# Altium footprint library lib_protel_HC_BOINA.PCBLIB: 726 footprints (part 29 of 46)
Each footprint in its own frame and in the unit in brackets; x right, y up, seen from the top. Pads: shape width x height; smd on the part's side, far side on the other; paste and mask are expansions set on the pad; w line width, h text height; cw(c..) or ccw(c..) is an arc to the next point about the centre after c.
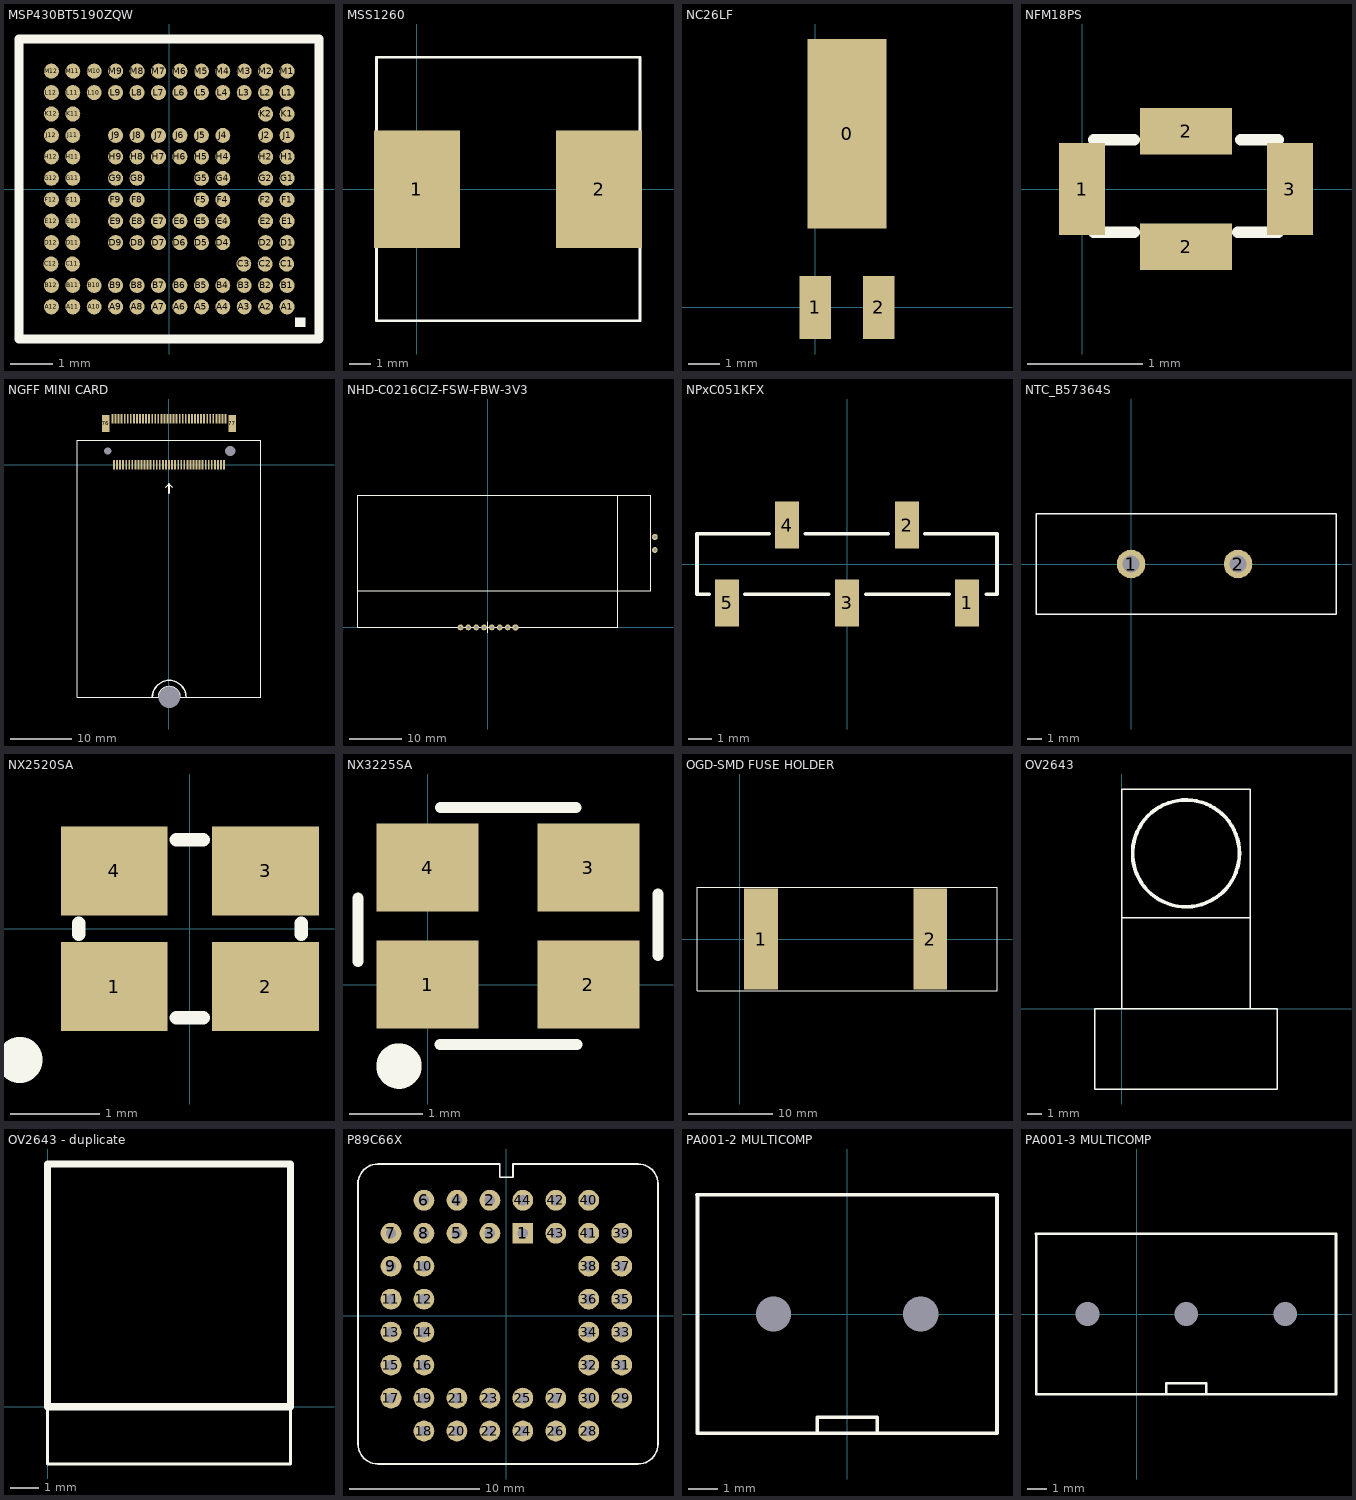
[diagram p28: the footprints below, top view; thin cyan lines are the x and y axes]

## MSP430BT5190ZQW [mm] "MSP430BT5190ZQW"
height 1
pads (113):
  round 0.35 smd mask+0.025: A1(2.755,-2.75) A2(2.255,-2.75) A3(1.755,-2.75) A4(1.255,-2.75) A5(0.755,-2.75) A6(0.255,-2.75) A7(-0.245,-2.75) A8(-0.745,-2.75) A9(-1.245,-2.75) A10(-1.745,-2.75) A11(-2.245,-2.75) A12(-2.745,-2.75) B1(2.755,-2.25) B2(2.255,-2.25) B3(1.755,-2.25) B4(1.255,-2.25) B5(0.755,-2.25) B6(0.255,-2.25) B7(-0.245,-2.25) B8(-0.745,-2.25) B9(-1.245,-2.25) B10(-1.745,-2.25) B11(-2.245,-2.25) B12(-2.745,-2.25) C1(2.745,-1.75) C2(2.245,-1.75) C3(1.745,-1.75) C11(-2.255,-1.75) C12(-2.755,-1.75) D1(2.755,-1.25) D2(2.255,-1.25) D4(1.255,-1.25) D5(0.755,-1.25) D6(0.255,-1.25) D7(-0.245,-1.25) D8(-0.745,-1.25) D9(-1.245,-1.25) D11(-2.245,-1.25) D12(-2.745,-1.25) E1(2.755,-0.75) E2(2.255,-0.75) E4(1.255,-0.75) E5(0.755,-0.75) E6(0.255,-0.75) E7(-0.245,-0.75) E8(-0.745,-0.75) E9(-1.245,-0.75) E11(-2.245,-0.75) E12(-2.745,-0.75) F1(2.755,-0.25) F2(2.255,-0.25) F4(1.255,-0.25) F5(0.755,-0.25) F8(-0.745,-0.25) F9(-1.245,-0.25) F11(-2.245,-0.25) F12(-2.745,-0.25) G1(2.755,0.25) G2(2.255,0.25) G4(1.255,0.25) G5(0.755,0.25) G8(-0.745,0.25) G9(-1.245,0.25) G11(-2.245,0.25) G12(-2.745,0.25) H1(2.755,0.75) H2(2.255,0.75) H4(1.255,0.75) H5(0.755,0.75) H6(0.255,0.75) H7(-0.245,0.75) H8(-0.745,0.75) H9(-1.245,0.75) H11(-2.245,0.75) H12(-2.745,0.75) J1(2.755,1.25) J2(2.255,1.25) J4(1.255,1.25) J5(0.755,1.25) J6(0.255,1.25) J7(-0.245,1.25) J8(-0.745,1.25) J9(-1.245,1.25) J11(-2.245,1.25) J12(-2.745,1.25) K1(2.755,1.75) K2(2.255,1.75) K11(-2.245,1.75) K12(-2.745,1.75) L1(2.755,2.25) L2(2.255,2.25) L3(1.755,2.25) L4(1.255,2.25) L5(0.755,2.25) L6(0.255,2.25) L7(-0.245,2.25) L8(-0.745,2.25) L9(-1.245,2.25) L10(-1.745,2.25) L11(-2.245,2.25) L12(-2.745,2.25) M1(2.755,2.75) M2(2.255,2.75) M3(1.755,2.75) M4(1.255,2.75) M5(0.755,2.75) M6(0.255,2.75) M7(-0.245,2.75) M8(-0.745,2.75) M9(-1.245,2.75) M10(-1.745,2.75) M11(-2.245,2.75) M12(-2.745,2.75)
Top Overlay:
  rectangle: 2.94,-3.22 3.19,-3
  lines w0.2: -3.5,-3.5 3.5,-3.5 3.5,3.5 -3.5,3.5 -3.5,-3.5

## MSS1260 [mm] "MSS1260"
height 6
pads (2):
  rect 4x5.5 smd: 1(0,0) 2(8.5,0)
Top Overlay:
  lines w0.127: -1.89,-6.14 10.41,-6.14 10.41,6.16 -1.89,6.16 -1.89,-6.14

## NC26LF [mm] "CLOCK CILINDRICO NC26LF"
height 2
pads (3):
  rect 2.5x6 smd: 0(1,5.5)
  rect 1x2 smd: 1(0,0) 2(2,0)

## NFM18PS [mm] "FILTRO"
height 0.6
pads (4):
  rect 0.4x0.8 smd: 1(0,0) 3(1.8,0)
  rect 0.8x0.4 smd: 2(0.9,-0.5) 2(0.9,0.5)
Top Overlay:
  lines w0.1: 0.1,-0.375 0.45,-0.375 ; 0.45,0.425 0.1,0.425 ; 1.375,0.425 1.7,0.425 ; 1.7,-0.375 1.35,-0.375 ; 0.1,0.425 0.1,0.425 ; 1.35,-0.375 1.35,-0.375 ; 1.7,0.425 1.7,0.425

## NGFF MINI CARD [mm] "MINI CARD FOR NGFF"
height 3.2
pads (80):
  round 0 hole 1.2: 0(-10,2.275)
  round 0 hole 3.5: 0(0.038,-37.975)
  round 0 hole 1.7: 0(10,2.275)
  rect 0.3x1.55 smd: 1(-9.25,7.55) 2(-9,0) 3(-8.75,7.55) 4(-8.5,0) 5(-8.25,7.55) 6(-8,0) 7(-7.75,7.55) 8(-7.5,0) 9(-7.25,7.55) 10(-7,0) 11(-6.75,7.55) 12(-6.5,0) 13(-6.25,7.55) 14(-6,0) 15(-5.75,7.55) 16(-5.5,0) 17(-5.25,7.55) 18(-5,0) 19(-4.75,7.55) 20(-4.5,0) 21(-4.25,7.55) 22(-4,0) 23(-3.75,7.55) 24(-3.5,0) 25(-3.25,7.55) 26(-3,0) 27(-2.75,7.55) 28(-2.5,0) 29(-2.25,7.55) 30(-2,0) 31(-1.75,7.55) 32(-1.5,0) 33(-1.25,7.55) 34(-1,0) 35(-0.75,7.55) 36(-0.5,0) 37(-0.25,7.55) 38(0,0) 39(0.25,7.55) 40(0.5,0) 41(0.75,7.55) 42(1,0) 43(1.25,7.55) 44(1.5,0) 45(1.75,7.55) 46(2,0) 47(2.25,7.55) 48(2.5,0) 49(2.75,7.55) 50(3,0) 51(3.25,7.55) 52(3.5,0) 53(3.75,7.55) 54(4,0) 55(4.25,7.55) 56(4.5,0) 57(4.75,7.55) 58(5,0) 59(5.25,7.55) 60(5.5,0) 61(5.75,7.55) 62(6,0) 63(6.25,7.55) 63(6.75,7.55) 64(6.5,0) 65(7.25,7.55) 66(7,0) 68(7.5,0) 69(7.75,7.55) 70(8,0) 71(8.25,7.55) 72(8.5,0) 73(8.75,7.55) 74(9,0) 75(9.25,7.55)
  rect 1.2x2.75 smd: 76(-10.35,6.793) 77(10.35,6.793)
Top Overlay:
  lines w0.1: -15,-37.975 15,-37.975 15,4.025 -15,4.025 -15,-37.975
  lines w0.254: -2.712,-37.975 cw(c0.038,-37.987) 2.787,-37.975 ; -1.712,-37.975 cw(c0.038,-37.983) 1.787,-37.975 ; -0.5,-3.625 -0.013,-3.137 -0.013,-3.125 ; -0.025,-3.125 0,-3.125 ; 0,-4.65 0,-3.125 ; 0.5,-3.625 0,-3.125

## NHD-C0216CIZ-FSW-FBW-3V3 [mm] "DISPLAY I2C"
height 5.5
pads (10):
  round 1.2 hole 0.6: 1(5.25,0)
  round 1.1 hole 0.6: 2(3.75,0) 3(2.25,0) 4(0.75,0) 5(-0.75,0) 6(-2.25,0) 7(-3.75,0) 8(-5.25,0) A(31.9,14.8)
  oval 1.1x1.2 hole 0.6: K(31.9,17.3)
Top Overlay:
  lines w0.2: -24.85,7 24.85,7 ; 0,-1.05 0,1.05 ; 24.84,7 24.84,25.3 ; 24.85,7 24.85,0 -24.85,0 -24.85,25.3 31.15,25.3 31.15,7 24.85,7

## NPxC051KFX [mm] "para NOPxCxx1KFXx-RC"
pads (5):
  rect 1x2 smd: 1(5.08,-1.65) 2(2.54,1.65) 3(0,-1.65) 4(-2.54,1.65) 5(-5.08,-1.65)
Top Overlay:
  lines w0.15: -5.825,-1.275 -6.35,-1.275 -6.35,1.275 -3.3,1.275 ; -4.325,-1.275 -0.775,-1.275 ; -1.775,1.275 1.75,1.275 ; 0.8,-1.275 4.325,-1.275 ; 3.3,1.275 6.35,1.275 6.35,-1.275 5.9,-1.275
3D body "10487, NPxC051KFXC-RC.STEP": height 7.1, standoff -0.4, extent -6.35,-2.17 6.35,2.1

## NTC_B57364S [mm] "NTC"
height 28
pads (2):
  round 2 hole 1.2: 1(0,0) 2(7.493,0)
Top Overlay:
  lines w0.1: -6.655,-3.505 -6.655,3.505 14.351,3.505 14.351,-3.505 -6.655,-3.505

## NX2520SA [mm] "CRISTAL NDK 26MHZ"
height 0.5
pads (4):
  rect 1.2x1 smd: 1(-0.85,-0.65) 2(0.85,-0.65) 3(0.85,0.65) 4(-0.85,0.65)
Top Overlay:
  lines w0.152: -1.25,-0.06 -1.25,0.06 ; -0.15,-1 0.15,-1 ; -0.15,1 0.15,1 ; 1.25,-0.06 1.25,0.06
  lines w0.5: -1.905,-1.473 cw(c-1.912,-1.473) -1.905,-1.472

## NX3225SA [mm] "CRISTAL NDK 32MHZ"
height 0.7
pads (4):
  rect 1.4x1.2 smd: 1(0,0) 2(2.2,0) 3(2.2,1.6) 4(0,1.6)
Top Overlay:
  lines w0.152: -0.95,0.32 -0.95,1.18 ; 0.17,-0.82 2.04,-0.82 ; 0.18,2.42 2.025,2.42 ; 3.15,0.4 3.15,1.24
  lines w0.5: -0.33,-1.114 cw(c-0.39,-1.114) -0.33,-1.11
3D body: height 0.55, standoff 0, extent -0.5,-0.45 2.7,2.05

## OGD-SMD FUSE HOLDER [mm] "PORTAFUSIBLES HASTA 10A"
height 13.5
pads (2):
  rect 4x12 smd: 1(2.5,0) 2(22.5,0)
Top Overlay:
  lines w0.127: -5.08,-6.096 30.4,-6.096 30.4,6.096 -5.08,6.096 -5.08,0 -5.08,-6.096

## OV2643 [mm] "CAMARA 2MP"
height 4.73
Top Overlay:
  circle w0.254: c4.4,10.6 r3.65
  lines w0.1: 0,6.2 0,0 8.8,0 8.8,6.2 ; 0,6.2 0,15 8.8,15 8.8,6.2 ; 0,6.2 8.8,6.2 ; -1.85,-5.5 -1.85,0 10.65,0 10.65,-5.5 -1.85,-5.5

## OV2643 - duplicate [mm] "CAMARA KAILAPTECH"
height 6.4
Top Overlay:
  lines w0.1: 0,0 0,-2 8.5,-2 8.5,0
  lines w0.254: 0,0 0,8.5 8.5,8.5 8.5,0 0.025,0 0,0.025

## P89C66X [mm] "microcontolador philips P89C66X"
pads (44):
  rect 1.6x1.6 on Top hole 0.8: 1(1.27,6.35)
  round 1.6 on Top hole 0.8: 2(-1.27,8.89) 3(-1.27,6.35) 4(-3.81,8.89) 5(-3.81,6.35) 6(-6.35,8.89) 7(-8.89,6.35) 8(-6.35,6.35) 9(-8.89,3.81) 10(-6.35,3.81) 11(-8.89,1.27) 12(-6.35,1.27) 13(-8.89,-1.27) 14(-6.35,-1.27) 15(-8.89,-3.81) 16(-6.35,-3.81) 17(-8.89,-6.35) 18(-6.35,-8.89) 19(-6.35,-6.35) 20(-3.81,-8.89) 21(-3.81,-6.35) 22(-1.27,-8.89) 23(-1.27,-6.35) 24(1.27,-8.89) 25(1.27,-6.35) 26(3.81,-8.89) 27(3.81,-6.35) 28(6.35,-8.89) 29(8.89,-6.35) 30(6.35,-6.35) 31(8.89,-3.81) 32(6.35,-3.81) 33(8.89,-1.27) 34(6.35,-1.27) 35(8.89,1.27) 36(6.35,1.27) 37(8.89,3.81) 38(6.35,3.81) 39(8.89,6.35) 40(6.35,8.89) 41(6.35,6.35) 42(3.81,8.89) 43(3.81,6.35) 44(1.27,8.89)
Top Overlay:
  lines w0.127: -11.428,10.162 cw(c-9.906,10.162) -9.906,11.684 -0.508,11.684 -0.508,10.668 0.508,10.668 0.508,11.684 10.158,11.684 ; -11.428,10.412 -11.428,-9.906 ccw(c-9.906,-9.906) -9.906,-11.428 10.158,-11.428 ; 10.16,-11.43 ccw(c10.16,-9.908) 11.682,-9.908 11.682,10.16 ccw(c10.16,10.16) 10.16,11.682

## PA001-2 MULTICOMP [mm] "paso 5mm altura 11mm"
height 11
pads (2):
  round 0 / inner round 0 / far side round 2.6 hole 1.2: 1(-2.5,0) 2(2.5,0)
Top Overlay:
  lines w0.127: -5.096,4.048 5.08,4.048 ; -5.08,4.039 -5.08,-4.039 -5.07,-4.048 5.08,-4.048 ; -1.016,-4.013 -1.016,-3.505 1.016,-3.505 1.016,-4.013 ; 5.08,-4.039 5.08,4.039

## PA001-3 MULTICOMP [mm] "paso 5mm altura 11mm"
height 11
pads (3):
  round 0 / inner round 0 / far side round 2.6 hole 1.2: 1(-2.5,0) 2(2.5,0) 3(7.5,0)
Top Overlay:
  lines w0.127: -5.096,4.048 10.058,4.048 10.058,-4.039 ; -5.08,4.039 -5.08,-4.039 -5.07,-4.048 10.058,-4.048 ; 1.473,-4.013 1.473,-3.505 3.505,-3.505 3.505,-4.013